# Altium footprint library IoWLabs.PcbLib: 55 footprints (part 1 of 4)
Each footprint in its own frame and in the unit in brackets; x right, y up, seen from the top. Pads: shape width x height; smd on the part's side, far side on the other; paste and mask are expansions set on the pad; w line width, h text height; cw(c..) or ccw(c..) is an arc to the next point about the centre after c.
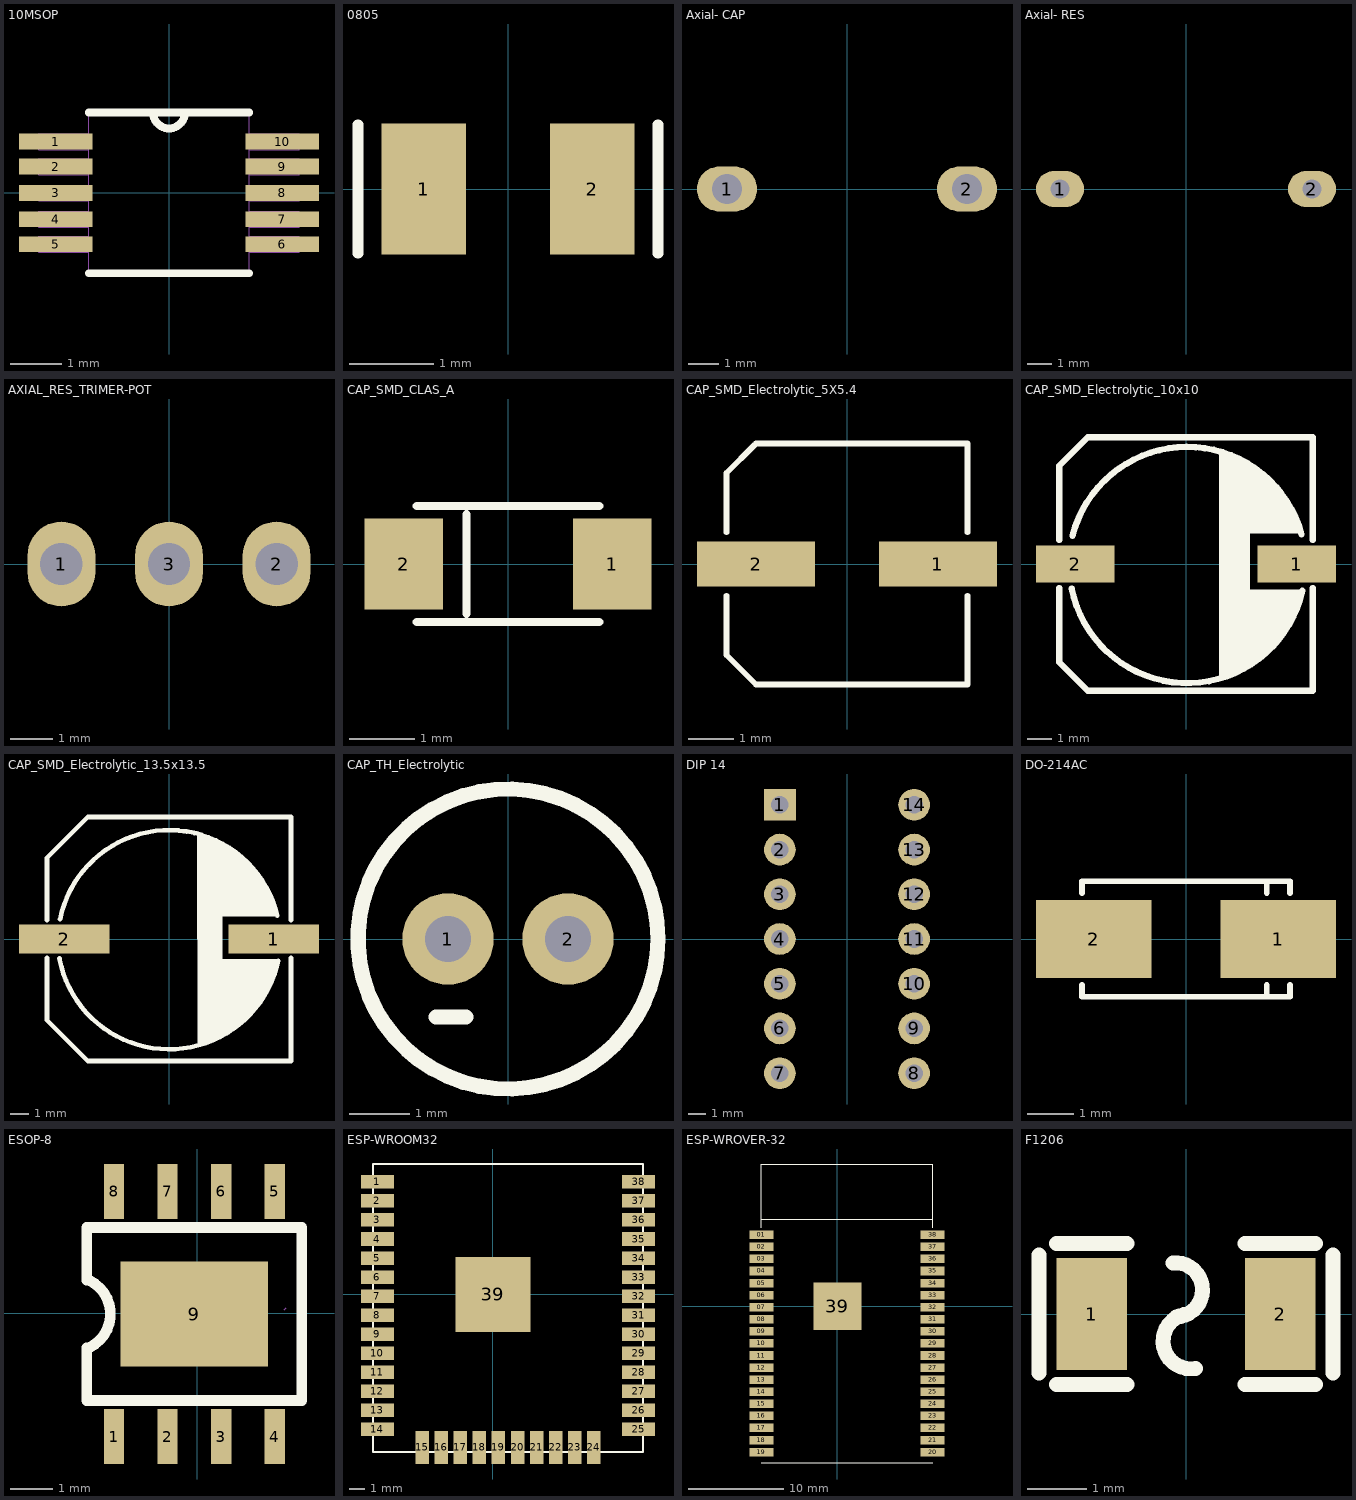
[diagram p0: the footprints below, top view; thin cyan lines are the x and y axes]

## 10MSOP [mil]
pads (10):
  rect 56x12 smd: 1(-86,39) 2(-86,20) 3(-86,0) 4(-86,-20) 5(-86,-39) 6(86,-39) 7(86,-20) 8(86,0) 9(86,20) 10(86,39)
Top Overlay:
  lines w6: -61,-61 61,-61 ; -61,61 -12,61 ; 61,61 12,61 ; -12,61 ccw(c0,61) 12,61 ; -12,61 12,61
Mechanical 1:
  lines w0: -12,61 ccw(c0,61) 12,61 ; -12,61 12,61 ; -12,61 -61,61 -61,-61 61,-61 61,61 12,61 ; -99,-45 -99,-33 -61,-33 -61,-45 -99,-45 ; -99,-26 -99,-14 -61,-14 -61,-26 -99,-26 ; -99,-6 -99,6 -61,6 -61,-6 -99,-6 ; -99,14 -99,26 -61,26 -61,14 -99,14 ; -99,33 -99,45 -61,45 -61,33 -99,33 ; 61,-45 61,-33 99,-33 99,-45 61,-45 ; 61,-26 61,-14 99,-14 99,-26 61,-26 ; 61,-6 61,6 99,6 99,-6 61,-6 ; 61,14 61,26 99,26 99,14 61,14 ; 61,33 61,45 99,45 99,33 61,33
3D body "10MSOP.step": height 45.28, standoff 0, extent -96.45,-59.05 96.46,59.06

## 0805 [mm]
pads (2):
  rect 1x1.55 smd: 1(-1,0) 2(1,0)
Top Overlay:
  lines w0.127: -1.778,-0.762 -1.778,0.762 ; 1.778,-0.762 1.778,0.762

## Axial- CAP [mm] "pitch 8"
pads (2):
  oval 2x1.5 hole 1: 1(-4,0) 2(4,0)
3D body "cap-ceramic.stp": height 12, standoff -4, extent -4.6,-3 4.6,2

## Axial- RES [mm] "pitch 10.5"
pads (2):
  oval 2x1.5 hole 0.8: 1(-5.25,0) 2(5.25,0)
3D body "Resistor0.25W.STEP": height 5.06, standoff -1.19, extent -5.55,-1.2 5.55,1.3

## AXIAL_RES_TRIMER-POT [mm]
pads (3):
  oval 1.6x2 hole 1: 1(-2.54,0) 2(2.54,0) 3(0,0)
3D body "TRIMER_POT.STEP": height 11.18, standoff -6, extent -4.763,-2.826 4.763,2.4

## CAP_SMD_CLAS_A [mm] "Tantalum Capacitor 1206"
pads (2):
  rect 1.2x1.4 smd: 1(1.6,0) 2(-1.6,0)
Top Overlay:
  lines w0.127: -1.397,-0.889 1.397,-0.889 ; -1.397,0.889 1.397,0.889 ; -0.635,-0.762 -0.635,0.762
3D body "tantalum 10uF.stp": height 1.6, standoff -0.1, extent -1.675,-0.813 1.725,0.787

## CAP_SMD_Electrolytic_5X5.4 [mm]
pads (2):
  rect 2.6x1 smd: 1(2,0) 2(-2,0)
Top Overlay:
  lines w0.127: -2.65,-0.7 -2.65,-2 -2,-2.65 2.65,-2.65 2.65,-0.7 ; -2.65,0.7 -2.65,2 -2.04,2.61 -2,2.65 2.65,2.65 2.65,0.7
3D body "PCAP_5x5_4-ELECT_NCA.step": height 5.57, standoff 0, extent -2.946,-2.756 2.946,2.756

## CAP_SMD_Electrolytic_10x10 [mm]
pads (2):
  rect 3.2x1.5 smd: 1(4.5,0) 2(-4.5,0)
Top Overlay:
  region: 1.35,4.6 1.35,-4.65 1.8,-4.45 2.4,-4.2 2.9,-3.9 3.25,-3.55 3.55,-3.35 3.85,-2.95 4.2,-2.35 4.45,-1.95 4.6,-1.6 4.75,-1.05 2.6,-1.05 2.6,1.1 2.6,1.25 4.65,1.25 4.5,1.8 4.2,2.45 3.95,2.9 3.4,3.45 2.8,3.85 2.2,4.2 1.8,4.5 1.35,4.65
  lines w0.254: -5.15,-0.981 -5.15,-4 -4,-5.15 5.15,-5.15 5.15,-0.981 ; -5.15,0.981 -5.15,4 -4,5.15 5.15,5.15 5.15,0.981 ; -4.65,-0.998 ccw(c0.05,-0.05) 4.731,-1.088 ; -4.614,1.147 cw(c0.05,-0.05) 4.701,1.196
3D body "CAPAE-D10.0x10.2.stp": height 10.5, standoff 0, extent -6,-5.25 6,5.25

## CAP_SMD_Electrolytic_13.5x13.5 [mm]
pads (2):
  rect 5x1.6 smd: 1(5.8,0) 2(-5.8,0)
Top Overlay:
  region: 1.57,5.92 1.59,-5.97 2.25,-5.72 2.91,-5.49 3.42,-5.16 3.75,-4.88 4.24,-4.55 4.62,-4.14 5.07,-3.56 5.3,-3.02 5.58,-2.62 5.71,-2.16 5.89,-1.74 6,-1.42 6.04,-1.16 6.04,-1.11 2.95,-1.12 2.95,0.05 2.95,1.23 6,1.25 5.85,1.83 5.64,2.45 5.29,3.13 4.95,3.7 4.57,4.12 4.27,4.45 3.84,4.82 3.16,5.25 2.15,5.75 1.58,5.95
  lines w0.254: -6.75,-1.031 -6.75,-4.5 -4.5,-6.75 6.75,-6.75 6.75,-1.031 ; -6.75,1.031 -6.75,4.5 -4.5,6.75 6.75,6.75 6.75,1.031 ; -6.061,-1.078 ccw(c0.003,0.068) 6.044,-1.194 ; -6.03,1.084 cw(c0.007,-0.133) 6,1.284
3D body "cap.step": height 13.5, standoff 0, extent -7.35,-6.75 7.55,6.75

## CAP_TH_Electrolytic [mil]
pads (2):
  round 60 hole 30: 1(-39.37,0) 2(39.37,0)
Top Overlay:
  circle w10: c0,0 r98.43
  lines w10: -47.24,-51.18 -27.56,-51.18
3D body "Aluminum Electrolytic Capacitor.stp": height 437.8, standoff -117.72, extent -98.03,-98.42 98.43,98.43

## DIP 14 [mm] "Generic DIP 14 th"
pads (14):
  rect 1.8x1.8 hole 1: 1(-3.81,7.62)
  round 1.8 hole 1: 2(-3.81,5.08) 3(-3.81,2.54) 4(-3.81,0) 5(-3.81,-2.54) 6(-3.81,-5.08) 7(-3.81,-7.62) 8(3.81,-7.62) 9(3.81,-5.08) 10(3.81,-2.54) 11(3.81,0) 12(3.81,2.54) 13(3.81,5.08) 14(3.81,7.62)
3D body "IC DIP 14-pin.step": height 4.55, standoff -2, extent -3.96,-8.71 3.96,8.71

## DO-214AC [mm]
pads (2):
  rect 2.5x1.7 smd: 1(2,0) 2(-2,0)
Top Overlay:
  lines w0.127: -2.25,-1 -2.25,-1.25 1.75,-1.25 ; -2.25,1 -2.25,1.25 2.25,1.25 2.25,1 ; 1.75,-1 1.75,-1.25 ; 1.75,1 1.75,1.25 ; 2.25,-1 2.25,-1.25 1.75,-1.25
3D body "DO-214AC (SMA).step": height 1.96, standoff 0.01, extent -2.555,-1.35 2.555,1.35

## ESOP-8 [mm]
pads (9):
  rect 0.48x1.3 smd: 1(-1.973,-2.922) 2(-0.703,-2.922) 3(0.567,-2.922) 4(1.837,-2.922) 5(1.837,2.895) 6(0.567,2.895) 7(-0.703,2.895) 8(-1.973,2.895)
  rect 3.5x2.5 smd: 9(-0.068,-0.014)
Top Overlay:
  lines w0.254: -2.618,-0.814 -2.618,-2.064 2.482,-2.064 2.482,2.036 ; -2.618,0.786 -2.618,2.036 2.482,2.036 ; -2.568,-0.814 ccw(c-2.943,-0.014) -2.568,0.786
Mechanical 15:
  lines w0.003: 2.066,0.088 2.117,0.139
3D body "sop8.STEP": height 1.55, standoff -0.01, extent -2.5,-2.99 2.4,2.99

## ESP-WROOM32 [mm]
pads (39):
  rect 2.2x0.9 smd: 1(-7.7,7.5) 2(-7.7,6.23) 3(-7.7,4.96) 4(-7.7,3.69) 5(-7.7,2.42) 6(-7.7,1.15) 7(-7.7,-0.12) 8(-7.7,-1.39) 9(-7.7,-2.66) 10(-7.7,-3.93) 11(-7.7,-5.2) 12(-7.7,-6.47) 13(-7.7,-7.74) 14(-7.7,-9.01) 25(9.7,-9.01) 26(9.7,-7.74) 27(9.7,-6.47) 28(9.7,-5.2) 29(9.7,-3.93) 30(9.7,-2.66) 31(9.7,-1.39) 32(9.7,-0.12) 33(9.7,1.15) 34(9.7,2.42) 35(9.7,3.69) 36(9.7,4.96) 37(9.7,6.23) 38(9.7,7.5)
  rect 0.9x2.2 smd: 15(-4.715,-10.21) 16(-3.445,-10.21) 17(-2.175,-10.21) 18(-0.905,-10.21) 19(0.365,-10.21) 20(1.635,-10.21) 21(2.905,-10.21) 22(4.175,-10.21) 23(5.445,-10.21) 24(6.715,-10.21)
  rect 5x5 smd: 39(0,0)
Top Overlay:
  lines w0.127: -8,-10.51 -8,8.69 10,8.69 10,-10.51 -8,-10.51
3D body "esp-wroom-32.stp": height 3, standoff -0.04, extent -8.121,-10.592 9.949,14.948

## ESP-WROVER-32 [mm]
pads (39):
  rect 2.5x0.9 smd: 01(-8,7.5) 02(-8,6.23) 03(-8,4.96) 04(-8,3.69) 05(-8,2.42) 06(-8,1.15) 07(-8,-0.12) 08(-8,-1.39) 09(-8,-2.66) 10(-8,-3.93) 11(-8,-5.2) 12(-8,-6.47) 13(-8,-7.74) 14(-8,-9.01) 15(-8,-10.28) 16(-8,-11.55) 17(-8,-12.82) 18(-8,-14.09) 19(-8,-15.36) 20(10,-15.36) 21(10,-14.09) 22(10,-12.82) 23(10,-11.55) 24(10,-10.28) 25(10,-9.01) 26(10,-7.74) 27(10,-6.47) 28(10,-5.2) 29(10,-3.93) 30(10,-2.66) 31(10,-1.39) 32(10,-0.12) 33(10,1.15) 34(10,2.42) 35(10,3.69) 36(10,4.96) 37(10,6.23) 38(10,7.5)
  rect 5x5 smd: 39(0,0)
Top Overlay:
  lines w0.127: -8,-16.46 10,-16.46 ; -8,8.256 -8,14.94 10,14.94 10,8.255 ; -8,9.144 10,9.144
3D body "ESP32-WROVER-I--3DModel-STEP-56544.STEP": height 3.65, standoff 0, extent -8.009,-16.436 9.991,14.964

## F1206 [mm]
pads (2):
  rect 1.2x1.9 smd: 1(-1.6,0) 2(1.6,0)
Top Overlay:
  lines w0.254: -2.5,-1 -2.5,1 ; -2.2,-1.2 -1,-1.2 ; -2.2,1.2 -1,1.2 ; -0.219,0.868 cw(c-0.178,0.411) -0.166,-0.048 ; 0.048,0.006 ccw(c0.079,-0.462) 0.158,-0.924 ; 1,-1.2 2.2,-1.2 ; 1,1.2 2.2,1.2 ; 2.5,-1 2.5,1
3D body "C1F_Fuse.stp": height 0.84, standoff 0, extent -1.702,-0.889 1.702,0.889